# Altium footprint library mfmc_footprints.PcbLib: 156 footprints (part 8 of 10)
Each footprint in its own frame and in the unit in brackets; x right, y up, seen from the top. Pads: shape width x height; smd on the part's side, far side on the other; paste and mask are expansions set on the pad; w line width, h text height; cw(c..) or ccw(c..) is an arc to the next point about the centre after c.
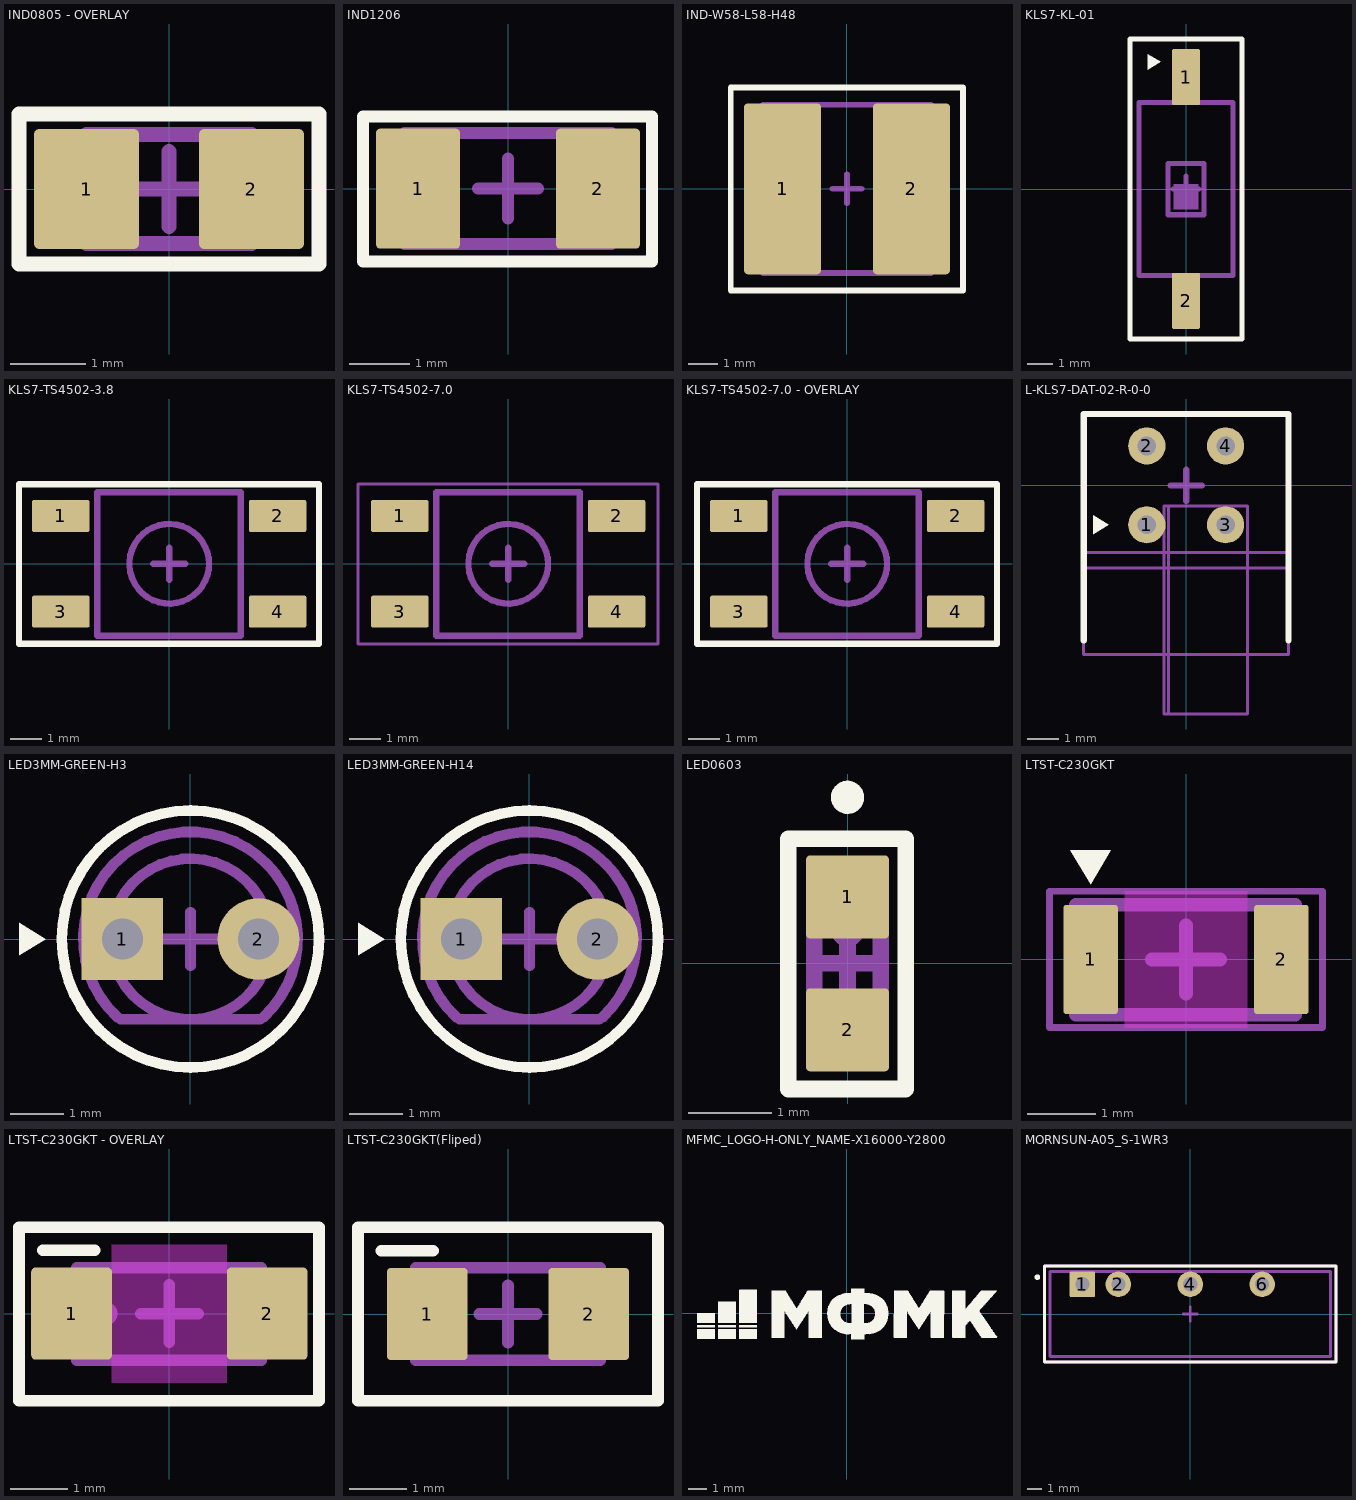
[diagram p7: the footprints below, top view; thin cyan lines are the x and y axes]

## IND0805 - OVERLAY [mm] "Chip Capacitor, 2-Leads, Body 2,00x1,25mm, IPC Medium Density"
height 1.45
pads (2):
  rrect10% 1.4x1.6 smd: 1(-1.1,0) 2(1.1,0)
Top Overlay:
  lines w0.2: -2,-1 2,-1 2,1 -2,1 -2,-1
Top Courtyard:
  lines w0.1: -2,-1 -2,1 2,1 2,-1 -2,-1
  lines w0.2: -0.5,0 0.5,0 ; 0,-0.5 0,0.5
Top Assembly:
  lines w0.2: -1.1,-0.725 1.1,-0.725 1.1,0.725 -1.1,0.725 -1.1,-0.725
Top Designator (Mech10):
  text ".Designator" at -7.618,-0.508 h1.52
3D body "CAPC2012X14N.step": height 1.45, standoff 0, extent -1.1,-0.725 1.1,0.725

## IND1206 [mm]
height 1.7
pads (2):
  rrect10% 1.4x2 smd: 1(-1.5,0) 2(1.5,0)
Top Overlay:
  lines w0.2: -2.413,-1.213 2.4,-1.213 2.4,1.2 -2.413,1.2 -2.413,-1.213
Top Courtyard:
  lines w0.1: -2.4,-1.2 2.4,-1.2 2.4,1.2 -2.4,1.2 -2.4,-1.2
  lines w0.2: -0.5,0 0.5,0 ; 0,-0.5 0,0.5
Top Assembly:
  lines w0.2: -1.725,-0.925 -1.725,0.925 1.725,0.925 1.725,-0.925 -1.725,-0.925
Top Designator (Mech10):
  text ".Designator" at -7.624,-0.514 h1.52
3D body "CAPC3216X17N.step": height 1.7, standoff 0, extent -1.725,-0.925 1.725,0.925

## IND-W58-L58-H48 [mm] "Precision Wire Wound Inductor, 2-Leads, Body 5,80x5,80mm, IPC Medium Density"
height 4.8
pads (2):
  rrect10% 2.65x5.9 smd: 1(-2.225,0) 2(2.225,0)
Top Overlay:
  lines w0.2: -4.013,-3.513 4,-3.513 4,3.5 -4.013,3.5 -4.013,-3.513
Top Courtyard:
  lines w0.1: -4,-3.5 4,-3.5 4,3.5 -4,3.5 -4,-3.5
  lines w0.2: -0.5,0 0.5,0 ; 0,-0.5 0,0.5
Top Assembly:
  lines w0.2: -2.9,-2.9 2.9,-2.9 2.9,2.9 -2.9,2.9 -2.9,-2.9
Top Designator (Mech10):
  text ".Designator" at -7.624,-0.514 h1.52
3D body "INDP5858X48N.step": height 4.9, standoff 0, extent -3,-2.9 3,2.9

## KLS7-KL-01 [mm] "End-stackable SMT Type DIP Switch"
height 4.3
pads (2):
  rrect10% 1.1x2.2 smd: 1(0,4.4) 2(0,-4.4)
Top Overlay:
  region: -1.5,5.3 -1,5 -1.5,4.7
  lines w0.2: -2.2,-5.9 -2.2,5.9 2.2,5.9 2.2,-5.9 -2.2,-5.9
Top Courtyard:
  lines w0.1: -2.2,-5.9 -2.2,5.9 2.2,5.9 2.2,-5.9 -2.2,-5.9
  lines w0.2: -0.5,0 0.5,0 ; 0,-0.5 0,0.5
Top Assembly:
  rectangle: -0.5,-0.8 0.5,0.2
  lines w0.2: -1.85,-3.4 -1.85,3.4 1.85,3.4 1.85,-3.4 -1.85,-3.4 ; -0.713,-1.013 0.7,-1.013 0.7,1 -0.713,1 -0.713,-1.013
  text "1" at -0.133,-2.5 h0.8
  text "ON" at -0.666,1.7 h0.8
Top Designator (Mech10):
  text ".Designator" at -7.618,-0.508 h1.52
3D body "KLS7-KL-01.STEP": height 4.3, standoff 0, extent -1.85,-4.845 1.85,4.845

## KLS7-TS4502-3.8 [mm] "4.5x4.5 Tact Switch"
height 3.8
pads (4):
  rrect10% 1.8x1 smd: 1(-3.4,1.5) 2(3.4,1.5) 3(-3.4,-1.5) 4(3.4,-1.5)
Top Overlay:
  lines w0.2: -4.713,-2.513 4.7,-2.513 4.7,2.5 -4.713,2.5 -4.713,-2.513
Top Courtyard:
  lines w0.1: -4.713,-2.513 4.7,-2.513 4.7,2.5 -4.713,2.5 -4.713,-2.513
  lines w0.2: -0.5,0 0.5,0 ; 0,-0.5 0,0.5
Top Assembly:
  circle w0.2: c0,0 r1.25
  lines w0.2: -2.263,-2.263 2.25,-2.263 2.25,2.25 -2.263,2.25 -2.263,-2.263
Top Designator (Mech10):
  text ".Designator" at -7.624,-0.514 h1.52
3D body "xb-ts-1109s-x-a.stp": height 3.8, standoff 0, extent -3.5,-2.25 3.5,2.25

## KLS7-TS4502-7.0 [mm] "4.5x4.5 Tact Switch"
height 7
pads (4):
  rrect10% 1.8x1 smd: 1(-3.4,1.5) 2(3.4,1.5) 3(-3.4,-1.5) 4(3.4,-1.5)
Top Courtyard:
  lines w0.1: -4.713,-2.513 -4.713,2.5 4.7,2.5 4.7,-2.513 -4.713,-2.513
  lines w0.2: -0.5,0 0.5,0 ; 0,-0.5 0,0.5
Top Assembly:
  circle w0.2: c0,0 r1.25
  lines w0.2: -2.263,-2.263 -2.263,2.25 2.25,2.25 2.25,-2.263 -2.263,-2.263
Top Designator (Mech10):
  text ".Designator" at -7.624,-0.514 h1.52
3D body "KLS7-TS4502-7.0-180-B.STEP": height 7, standoff 0, extent -3.5,-2.25 3.5,2.25

## KLS7-TS4502-7.0 - OVERLAY [mm] "4.5x4.5 Tact Switch"
height 7
pads (4):
  rrect10% 1.8x1 smd: 1(-3.4,1.5) 2(3.4,1.5) 3(-3.4,-1.5) 4(3.4,-1.5)
Top Overlay:
  lines w0.2: -4.713,-2.513 4.7,-2.513 4.7,2.5 -4.713,2.5 -4.713,-2.513
Top Courtyard:
  lines w0.1: -4.713,-2.513 4.7,-2.513 4.7,2.5 -4.713,2.5 -4.713,-2.513
  lines w0.2: -0.5,0 0.5,0 ; 0,-0.5 0,0.5
Top Assembly:
  circle w0.2: c0,0 r1.25
  lines w0.2: -2.263,-2.263 2.25,-2.263 2.25,2.25 -2.263,2.25 -2.263,-2.263
Top Designator (Mech10):
  text ".Designator" at -7.624,-0.514 h1.52
3D body "KLS7-TS4502-7.0-180-B.STEP": height 7, standoff 0, extent -3.5,-2.25 3.5,2.25

## L-KLS7-DAT-02-R-0-0 [mm] "DIP-Switch 2 switches"
height 9.6
pads (4):
  round 1.2 hole 0.6: 1(-1.27,-1.27) 2(-1.27,1.27) 3(1.27,-1.27) 4(1.27,1.27)
Top Overlay:
  region: -3,-0.97 -2.5,-1.27 -3,-1.57
  lines w0.2: -3.3,-5 -3.3,2.3 3.3,2.3 3.3,-5
Top Courtyard:
  lines w0.1: -3.313,-5.448 3.3,-5.448 3.3,2.3 -3.313,2.3 -3.313,-5.448
  lines w0.2: -0.5,0 0.5,0 ; 0,-0.5 0,0.5
Top Assembly:
  lines w0.1: -0.713,-7.37 1.97,-7.37 1.97,-0.663 -0.713,-0.663 ; -0.713,-7.37 -0.713,-0.663 ; -0.713,-7.37 -0.57,-7.37 -0.57,-0.663 -0.713,-0.663 ; -0.713,-7.37 -0.713,-0.663 ; -3.313,-2.663 3.3,-2.663 3.3,-2.17 -3.313,-2.17 -3.313,-2.663
Top Designator (Mech10):
  text ".Designator" at -7.618,-3.543 h1.52
3D body "L-KLS7-DAT-02-R-0-0.STEP": height 9.61, standoff -2.99, extent -3.32,-8.47 3.32,1.345

## LED3MM-GREEN-H3 [mil]
height 196.85
pads (2):
  rect 60x60 hole 30: 1(-50,0)
  round 60 hole 30: 2(50,0)
Top Overlay:
  circle w7.87: c0,0 r94.49
  region: -106.3,0 -125.98,11.81 -125.98,-11.81
Top Courtyard:
  circle w3.94: c0,0 r94.49
  lines w7.87: -19.68,0 19.68,0 ; 0,-19.68 0,19.68
Top Assembly:
  circle w7.87: c0,0 r59.06
  lines w7.87: -53.73,-57.56 cw(c0,0) 53.73,-57.56 ; -51.18,-59.06 51.18,-59.06
Top Designator (Mech10):
  text ".Designator" at -313.68,-19.99 h60
3D body "LED3MM-GREEN-H3.STEP": height 196.85, standoff -118.11, extent -78.74,-59.06 78.74,78.74

## LED3MM-GREEN-H14 [mil]
height 629.92
pads (2):
  rect 60x60 hole 30: 1(-50,0)
  round 60 hole 30: 2(50,0)
Top Overlay:
  circle w7.87: c0,0 r94.49
  region: -106.3,0 -125.98,11.81 -125.98,-11.81
Top Courtyard:
  circle w3.94: c0,0 r94.49
  lines w7.87: -19.68,0 19.68,0 ; 0,-19.68 0,19.68
Top Assembly:
  circle w7.87: c0,0 r59.06
  lines w7.87: -53.73,-57.56 cw(c0,0) 53.73,-57.56 ; -51.18,-59.06 51.18,-59.06
Top Designator (Mech10):
  text ".Designator" at -313.68,-19.99 h60
3D body "LED3MM-GREEN-H14.STEP": height 629.92, standoff -118.11, extent -78.74,-59.06 78.74,78.74

## LED0603 [mm]
pads (2):
  rrect10% 1x1 smd: 1(0,0.8) 2(0,-0.8)
Top Overlay:
  circle w0.2: c0,2 r0.1
  lines w0.2: -0.713,-1.513 0.7,-1.513 0.7,1.5 -0.713,1.5 -0.713,-1.513
Top Courtyard:
  lines w0.1: -0.7,-1.5 0.7,-1.5 0.7,1.5 -0.7,1.5 -0.7,-1.5
  lines w0.2: -0.3,0 0.3,0 ; 0,-0.3 0,0.3
Top Assembly:
  circle w0.2: c0,0.4 r0.1
  lines w0.2: -0.4,-0.8 0.4,-0.8 0.4,0.8 -0.4,0.8 -0.4,-0.8
Top Designator (Mech10):
  text ".Designator" at -7.624,-0.214 h1.52
3D body "User Library-LED SMD0603.STEP": height 0.68, standoff 0, extent -0.368,-0.825 0.357,0.825

## LTST-C230GKT [mm] "Reverse mount Chip LED"
height 0.3
pads (2):
  rrect10% 0.8x1.6 smd: 1(-1.4,0) 2(1.4,0)
Top Overlay:
  region: -1.4,1.1 -1.7,1.6 -1.1,1.6
Keep-Out Layer:
  board cut-out: -0.9,1 0.9,1 0.9,-1 -0.9,-1
Top Courtyard:
  lines w0.1: -2,-1 2,-1 2,1 -2,1 -2,-1
  lines w0.2: -0.5,0 0.5,0 ; 0,-0.5 0,0.5
Top Assembly:
  rectangle: -1.6,-0.8 -1.2,0.8
  lines w0.2: -1.613,-0.813 1.6,-0.813 1.6,0.8 -1.613,0.8 -1.613,-0.813
Top Designator (Mech10):
  text ".Designator" at -7.618,-0.233 h1.52
3D body "LTST-C230GKT.STEP": height 0.28, standoff -0.82, extent -1.6,-0.8 1.6,0.8

## LTST-C230GKT - OVERLAY [mm] "Reverse mount Chip LED"
height 0.3
pads (2):
  rrect10% 1.4x1.6 smd: 1(-1.7,0) 2(1.7,0)
Top Overlay:
  lines w0.2: -2.2,1.1 -1.3,1.1 ; -2.613,-1.513 2.6,-1.513 2.6,1.5 -2.613,1.5 -2.613,-1.513
Keep-Out Layer:
  board cut-out: -1,1.2 1,1.2 1,-1.2 -1,-1.2
Top Courtyard:
  lines w0.1: -2.613,-1.513 2.6,-1.513 2.6,1.5 -2.613,1.5 -2.613,-1.513
  lines w0.2: -0.5,0 0.5,0 ; 0,-0.5 0,0.5
Top Assembly:
  circle w0.2: c-1.1,0 r0.1
  lines w0.2: -1.613,-0.813 1.6,-0.813 1.6,0.8 -1.613,0.8 -1.613,-0.813
Top Designator (Mech10):
  text ".Designator" at -7.624,-0.514 h1.52
3D body "LTST-C230GKT.STEP": height 0.28, standoff -0.82, extent -1.6,-0.8 1.6,0.8

## LTST-C230GKT(Fliped) [mm]
height 1.1
pads (2):
  rrect10% 1.4x1.6 smd: 1(-1.4,0) 2(1.4,0)
Top Overlay:
  lines w0.2: -2.2,1.1 -1.3,1.1 ; -2.6,-1.5 2.6,-1.5 2.6,1.5 -2.6,1.5 -2.6,-1.5
Top Courtyard:
  lines w0.1: -2.6,-1.5 2.6,-1.5 2.6,1.5 -2.6,1.5 -2.6,-1.5
  lines w0.2: -0.5,0 0.5,0 ; 0,-0.5 0,0.5
Top Assembly:
  circle w0.2: c-1.1,0 r0.1
  lines w0.2: -1.6,-0.8 1.6,-0.8 1.6,0.8 -1.6,0.8 -1.6,-0.8
Top Designator (Mech10):
  text ".Designator" at -7.618,-0.508 h1.52
3D body "LTST-C230GKT.STEP": height 1.1, standoff 0, extent -1.6,-0.8 1.6,0.8

## MFMC_LOGO-H-ONLY_NAME-X16000-Y2800 [mm] "Mfmc Logo"
Top Overlay:
  drawing of 13 lines, arcs and shapes, not listed
Top Designator (Mech10):
  text ".Designator" at -7.615,-0.559 h1.52

## MORNSUN-A05_S-1WR3 [mm]
height 10.16
pads (4):
  rrect10% 1.8x1.8 hole 1: 1(-7.62,2.1)
  round 1.8 hole 1: 2(-5.08,2.1) 4(0,2.1) 6(5.08,2.1)
Top Overlay:
  circle w0.2: c-10.8,2.6 r0.1
  lines w0.2: -10.3,-3.4 10.3,-3.4 10.3,3.4 -10.3,3.4 -10.3,-3.4
Top Courtyard:
  lines w0.2: -0.5,0 0.5,0 ; 0,-0.5 0,0.5 ; -10.3,-3.4 10.3,-3.4 10.3,3.4 -10.3,3.4 -10.3,-3.4
Top Assembly:
  lines w0.2: -9.913,-3.013 9.9,-3.013 9.9,3 -9.913,3 -9.913,-3.013
Top Designator (Mech10):
  text ".Designator" at -7.918,-0.758 h1.52
3D body "User Library-SIP-B0505S.STEP": height 10, standoff -4.1, extent -9.8,-4 9.8,3